# Altium footprint library Molex FFC - FPC Connectors (Through-Hole).PcbLib: 219 footprints (part 3 of 14)
Each footprint in its own frame and in the unit in brackets; x right, y up, seen from the top. Pads: shape width x height; smd on the part's side, far side on the other; paste and mask are expansions set on the pad; w line width, h text height; cw(c..) or ccw(c..) is an arc to the next point about the centre after c.
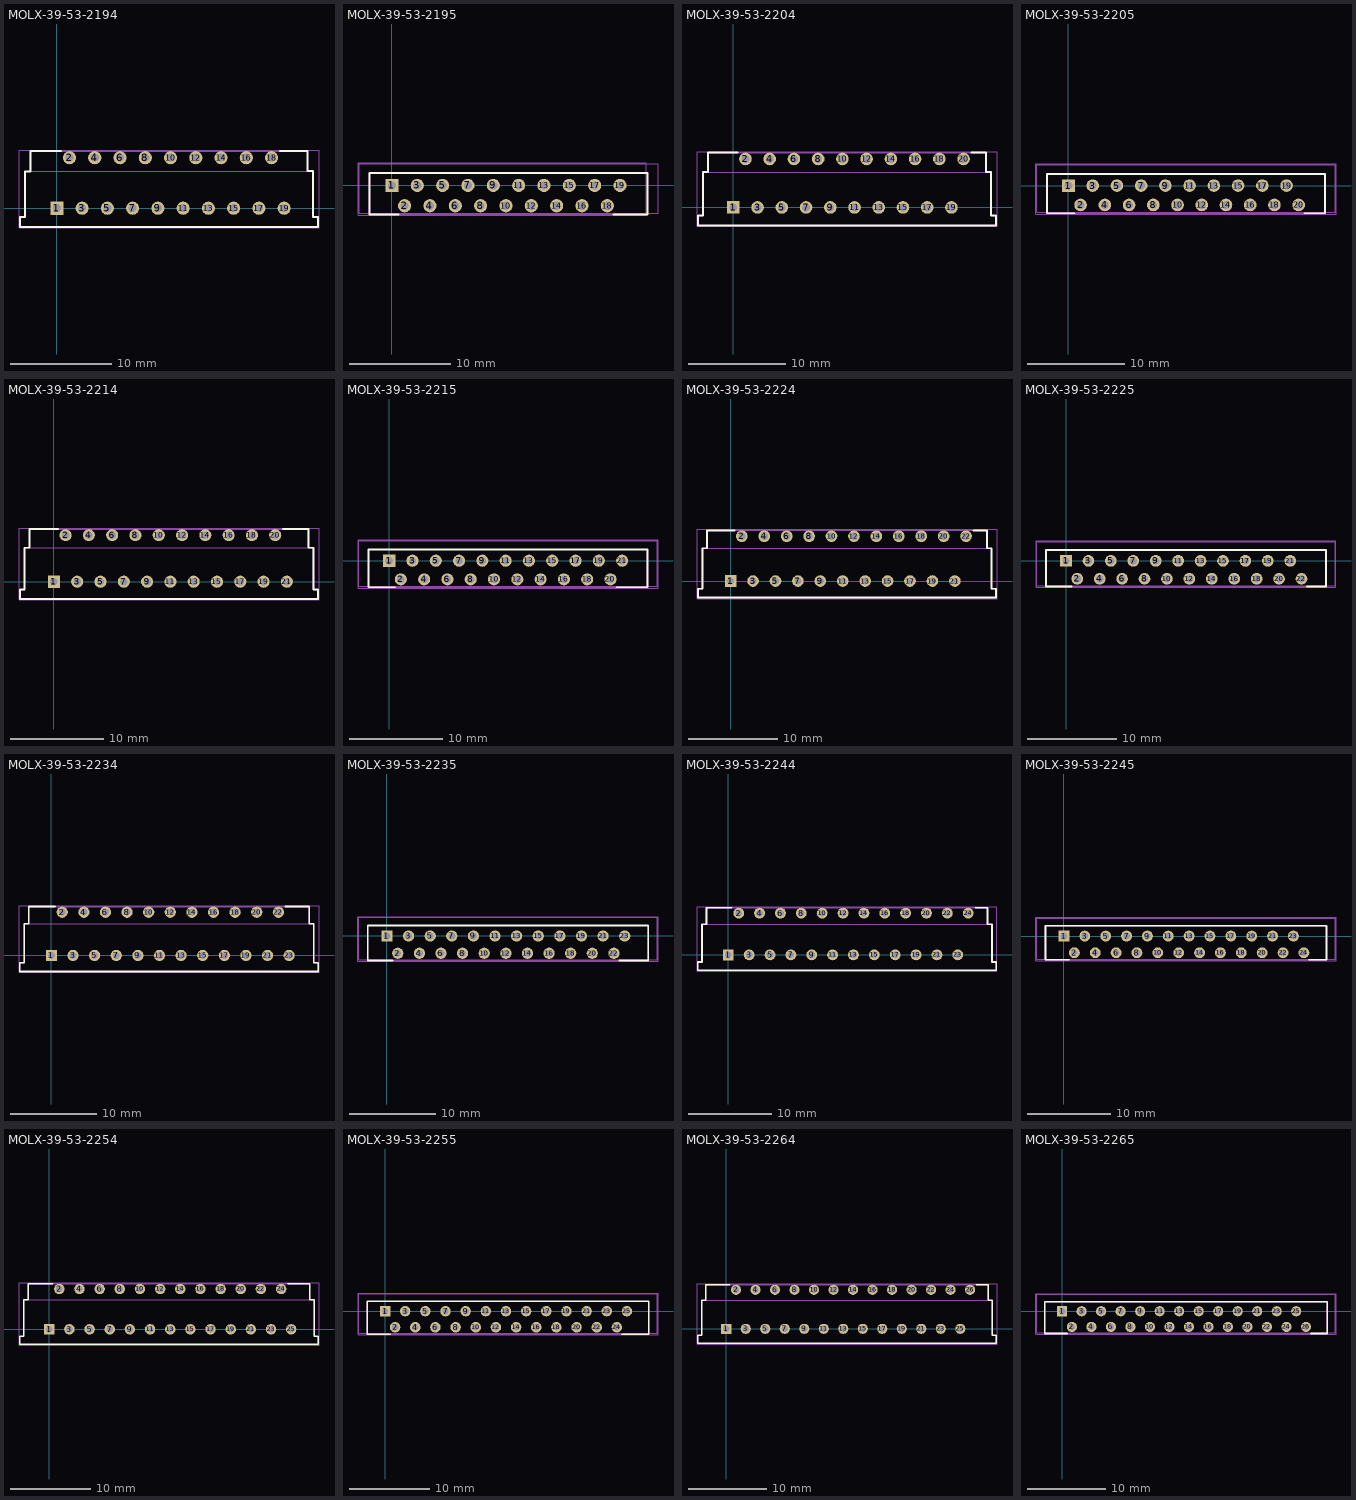
[diagram p2: the footprints below, top view; thin cyan lines are the x and y axes]

## MOLX-39-53-2194 [mm] "FPC Connector, 19-Leads, Right Angle, Pitch 1.25 mm, Mated Height 5.0 mm, Through Hole"
height 5.412
pads (19):
  rect 1.3x1.3 hole 0.8: 1(0,0)
  round 1.3 hole 0.8: 2(1.25,5) 3(2.5,0) 4(3.75,5) 5(5,0) 6(6.25,5) 7(7.5,0) 8(8.75,5) 9(10,0) 10(11.25,5) 11(12.5,0) 12(13.75,5) 13(15,0) 14(16.25,5) 15(17.5,0) 16(18.75,5) 17(20,0) 18(21.25,5) 19(22.5,0)
Top Overlay:
  lines w0.2: -2.62,3.65 -3.15,3.65 -3.15,-0.85 -3.65,-0.85 -3.65,-1.85 25.85,-1.85 25.85,-0.85 25.35,-0.85 25.35,3.65 ; -2.62,3.66 -2.62,5.65 0.425,5.65 ; 22.075,5.65 24.82,5.65 24.82,3.68 25.35,3.68
Mechanical 13:
  lines w0.1: -2.62,3.66 -2.62,5.65 24.82,5.65 24.82,3.68 ; -3.65,-1.85 -3.65,-0.85 -3.15,-0.85 -3.15,3.65 25.35,3.65 25.35,-0.85 25.85,-0.85 25.85,-1.85 -3.65,-1.85
Mechanical 15:
  lines w0.05: -3.75,-1.95 25.95,-1.95 25.95,5.75 -3.75,5.75 -3.75,-1.95
3D body "039532194.stp": height 5.41, standoff -3.49, extent -3.65,-1.85 25.85,5.65

## MOLX-39-53-2195 [mm] "FPC Connector, 19-Leads, Vertical, Pitch 1.25 mm, Mated Height 7.5 mm, Through Hole"
height 7.512
pads (19):
  rect 1.3x1.3 hole 0.8: 1(0,0)
  round 1.3 hole 0.8: 2(1.25,-2) 3(2.5,0) 4(3.75,-2) 5(5,0) 6(6.25,-2) 7(7.5,0) 8(8.75,-2) 9(10,0) 10(11.25,-2) 11(12.5,0) 12(13.75,-2) 13(15,0) 14(16.25,-2) 15(17.5,0) 16(18.75,-2) 17(20,0) 18(21.25,-2) 19(22.5,0)
Top Overlay:
  lines w0.2: 0.633,-2.85 -2.22,-2.85 -2.22,1.22 25.22,1.22 25.22,-2.85 21.867,-2.85
Mechanical 13:
  lines w0.1: -3.25,-2.75 26.25,-2.75 26.25,2.15 -3.25,2.15 -3.25,-2.75 ; -2.22,-2.85 -2.22,1.22 25.22,1.22 25.22,-2.85 -2.22,-2.85
Mechanical 15:
  lines w0.05: -3.35,-2.95 -3.35,2.25 25.1,2.25 25.1,-2.95 -3.35,-2.95
3D body "039532195.stp": height 7.51, standoff -3.49, extent -3.25,-2.85 26.25,2.15

## MOLX-39-53-2204 [mm] "FPC Connector, 20-Leads, Right Angle, Pitch 1.25 mm, Mated Height 5.0 mm, Through Hole"
height 5.412
pads (20):
  rect 1.3x1.3 hole 0.8: 1(0,0)
  round 1.3 hole 0.8: 2(1.25,5) 3(2.5,0) 4(3.75,5) 5(5,0) 6(6.25,5) 7(7.5,0) 8(8.75,5) 9(10,0) 10(11.25,5) 11(12.5,0) 12(13.75,5) 13(15,0) 14(16.25,5) 15(17.5,0) 16(18.75,5) 17(20,0) 18(21.25,5) 19(22.5,0) 20(23.75,5)
Top Overlay:
  lines w0.2: 0.425,5.65 -2.62,5.65 -2.62,3.649 -3.15,3.649 -3.15,-0.85 -3.65,-0.85 -3.65,-1.85 27.1,-1.85 27.1,-0.85 26.6,-0.85 26.6,3.65 26.07,3.65 26.07,5.65 24.575,5.65
Mechanical 13:
  lines w0.1: -2.62,3.649 -3.15,3.649 -3.15,-0.85 -3.65,-0.85 -3.65,-1.85 27.1,-1.85 27.1,-0.85 26.6,-0.85 26.6,3.65 26.07,3.65 26.07,5.65 -2.62,5.65 -2.62,3.649 26.07,3.649
Mechanical 15:
  lines w0.05: -3.75,-1.95 27.2,-1.95 27.2,5.75 -3.75,5.75 -3.75,-1.95
3D body "039532204.stp": height 5.41, standoff -3.49, extent -3.649,-1.849 27.101,5.651

## MOLX-39-53-2205 [mm] "FPC Connector, 20-Leads, Vertical, Pitch 1.25 mm, Mated Height 7.5 mm, Through Hole"
height 7.512
pads (21):
  rect 1.3x1.3 hole 0.8: 1(0,0)
  round 1.3 hole 0.8: 2(1.25,-2) 3(2.5,0) 4(3.75,-2) 5(5,0) 6(6.25,-2) 7(7.5,0) 9(10,0) 10(11.25,-2) 11(12.5,0) 12(13.75,-2) 13(15,0) 14(16.25,-2) 15(17.5,0) 16(18.75,-2) 17(20,0) 17(20,0) 18(21.25,-2) 19(22.5,0) 20(23.75,-2)
  round 1.3 hole 0.762: 8(8.75,-2)
Top Overlay:
  lines w0.2: 0.633,-2.85 -2.22,-2.85 -2.22,1.22 26.47,1.22 26.47,-2.85 24.367,-2.85
Mechanical 13:
  lines w0.1: 27.5,-2.75 27.5,-2.75 ; 27.5,-2.75 27.5,2.15 -3.25,2.15 -3.25,-2.75 27.5,-2.75 ; -2.22,-2.85 -2.22,1.22 26.47,1.22 26.47,-2.85 -2.22,-2.85
Mechanical 15:
  lines w0.05: -3.35,-2.95 27.6,-2.95 27.6,2.25 -3.35,2.25 -3.35,-2.95
3D body "039532205.stp": height 7.51, standoff -3.49, extent -3.25,-2.85 27.5,2.15

## MOLX-39-53-2214 [mm] "FPC Connector, 21-Leads, Right Angle, Pitch 1.25 mm, Mated Height 5.0 mm, Through Hole"
height 5.412
pads (21):
  rect 1.3x1.3 hole 0.8: 1(0,0)
  round 1.3 hole 0.8: 2(1.25,5) 3(2.5,0) 4(3.75,5) 5(5,0) 6(6.25,5) 7(7.5,0) 8(8.75,5) 9(10,0) 10(11.25,5) 11(12.5,0) 12(13.75,5) 13(15,0) 14(16.25,5) 15(17.5,0) 16(18.75,5) 17(20,0) 18(21.25,5) 19(22.5,0) 20(23.75,5) 21(25,0)
Top Overlay:
  lines w0.2: 0.425,5.65 -2.62,5.65 -2.62,3.649 -3.15,3.649 -3.15,-0.85 -3.65,-0.85 -3.65,-1.85 28.35,-1.85 28.35,-0.85 27.85,-0.85 27.85,3.65 27.32,3.65 27.32,5.65 24.575,5.65
Mechanical 13:
  lines w0.1: -2.62,3.649 -3.15,3.649 -3.15,-0.85 -3.65,-0.85 -3.65,-1.85 28.35,-1.85 28.35,-0.85 27.85,-0.85 27.85,3.65 27.32,3.65 27.32,5.65 -2.62,5.65 -2.62,3.649 27.32,3.649
Mechanical 15:
  lines w0.05: -3.75,-1.95 28.45,-1.95 28.45,5.75 -3.75,5.75 -3.75,-1.95
3D body "039532214.stp": height 5.41, standoff -3.49, extent -3.649,-1.85 28.351,5.65

## MOLX-39-53-2215 [mm] "FPC Connector, 21-Leads, Vertical, Pitch 1.25 mm, Mated Height 7.5 mm, Through Hole"
height 7.512
pads (22):
  rect 1.3x1.3 hole 0.8: 1(0,0)
  round 1.3 hole 0.8: 2(1.25,-2) 3(2.5,0) 4(3.75,-2) 5(5,0) 6(6.25,-2) 7(7.5,0) 9(10,0) 10(11.25,-2) 11(12.5,0) 12(13.75,-2) 13(15,0) 14(16.25,-2) 15(17.5,0) 16(18.75,-2) 17(20,0) 17(20,0) 18(21.25,-2) 19(22.5,0) 20(23.75,-2) 21(25,0)
  round 1.3 hole 0.762: 8(8.75,-2)
Top Overlay:
  lines w0.2: 0.633,-2.85 -2.22,-2.85 -2.22,1.22 27.72,1.22 27.72,-2.85 24.367,-2.85
Mechanical 13:
  lines w0.1: -3.25,-2.75 -3.25,2.15 28.75,2.15 28.75,-2.75 -3.25,-2.75 ; -2.22,-2.85 -2.22,1.22 27.72,1.22 27.72,-2.85 -2.22,-2.85
Mechanical 15:
  lines w0.05: -3.35,-2.95 -3.35,2.25 28.85,2.25 28.85,-2.95 -3.35,-2.95
3D body "039532215.stp": height 7.51, standoff -3.49, extent -3.25,-2.85 28.75,2.15

## MOLX-39-53-2224 [mm] "FPC Connector, 22-Leads, Right Angle, Pitch 1.25 mm, Mated Height 5.0 mm, Through Hole"
height 5.412
pads (22):
  rect 1.3x1.3 hole 0.8: 1(0,0)
  round 1.3 hole 0.8: 2(1.25,5) 3(2.5,0) 4(3.75,5) 5(5,0) 6(6.25,5) 7(7.5,0) 8(8.75,5) 9(10,0) 10(11.25,5) 11(12.5,0) 12(13.75,5) 13(15,0) 14(16.25,5) 15(17.5,0) 16(18.75,5) 17(20,0) 18(21.25,5) 19(22.5,0) 20(23.75,5) 21(25,0) 22(26.25,5)
Top Overlay:
  lines w0.2: 0.425,5.65 -2.62,5.65 -2.62,3.649 -3.15,3.649 -3.15,-0.85 -3.65,-0.85 -3.65,-1.85 29.6,-1.85 29.6,-0.85 29.1,-0.85 29.1,3.65 28.57,3.65 28.57,5.65 27.075,5.65
Mechanical 13:
  lines w0.1: -2.62,3.649 -3.15,3.649 -3.15,-0.85 -3.65,-0.85 -3.65,-1.85 29.6,-1.85 29.6,-0.85 29.1,-0.85 29.1,3.65 28.57,3.65 28.57,5.65 -2.62,5.65 -2.62,3.649 28.57,3.649
Mechanical 15:
  lines w0.05: -3.75,-1.95 -3.75,5.75 29.7,5.75 29.7,-1.95 -3.75,-1.95
3D body "039532224.stp": height 5.41, standoff -3.49, extent -3.649,-1.85 29.601,5.65

## MOLX-39-53-2225 [mm] "FPC Connector, 22-Leads, Vertical, Pitch 1.25 mm, Mated Height 7.5 mm, Through Hole"
height 7.512
pads (23):
  rect 1.3x1.3 hole 0.8: 1(0,0)
  round 1.3 hole 0.8: 2(1.25,-2) 3(2.5,0) 4(3.75,-2) 5(5,0) 6(6.25,-2) 7(7.5,0) 9(10,0) 10(11.25,-2) 11(12.5,0) 12(13.75,-2) 13(15,0) 14(16.25,-2) 15(17.5,0) 16(18.75,-2) 17(20,0) 17(20,0) 18(21.25,-2) 19(22.5,0) 20(23.75,-2) 21(25,0) 22(26.25,-2)
  round 1.3 hole 0.762: 8(8.75,-2)
Top Overlay:
  lines w0.2: 0.633,-2.85 -2.22,-2.85 -2.22,1.22 28.97,1.22 28.97,-2.85 26.867,-2.85
Mechanical 13:
  lines w0.1: -3.25,-2.75 30,-2.75 30,2.15 -3.25,2.15 -3.25,-2.75 ; -2.22,-2.85 28.97,-2.85 28.97,1.22 -2.22,1.22 -2.22,-2.85
Mechanical 15:
  lines w0.05: 30,-2.95 -3.35,-2.95 -3.35,2.25 30.1,2.25 30.1,-2.95
3D body "039532225.stp": height 7.51, standoff -3.49, extent -3.25,-2.85 30,2.15

## MOLX-39-53-2234 [mm] "FPC Connector, 23-Leads, Right Angle, Pitch 1.25 mm, Mated Height 5.0 mm, Through Hole"
height 5.412
pads (23):
  rect 1.3x1.3 hole 0.8: 1(0,0)
  round 1.3 hole 0.8: 2(1.25,5) 3(2.5,0) 4(3.75,5) 5(5,0) 6(6.25,5) 7(7.5,0) 8(8.75,5) 9(10,0) 10(11.25,5) 11(12.5,0) 12(13.75,5) 13(15,0) 14(16.25,5) 15(17.5,0) 16(18.75,5) 17(20,0) 18(21.25,5) 19(22.5,0) 20(23.75,5) 21(25,0) 22(26.25,5) 23(27.5,0)
Top Overlay:
  lines w0.2: 0.425,5.65 -2.62,5.65 -2.62,3.649 -3.15,3.649 -3.15,-0.85 -3.65,-0.85 -3.65,-1.85 30.85,-1.85 30.85,-0.85 30.35,-0.85 30.35,3.65 29.82,3.65 29.82,5.65 27.075,5.65
Mechanical 13:
  lines w0.1: -2.62,3.649 -3.15,3.649 -3.15,-0.85 -3.65,-0.85 -3.65,-1.85 30.85,-1.85 30.85,-0.85 30.35,-0.85 30.35,3.65 29.82,3.65 29.82,5.65 -2.62,5.65 -2.62,3.649 29.82,3.649
Mechanical 15:
  lines w0.05: -3.75,-1.95 -3.75,5.75 30.95,5.75 30.95,-1.95 -3.75,-1.95
3D body "039532234.stp": height 5.41, standoff -3.49, extent -3.649,-1.849 30.851,5.651

## MOLX-39-53-2235 [mm] "FPC Connector, 23-Leads, Vertical, Pitch 1.25 mm, Mated Height 7.5 mm, Through Hole"
height 7.512
pads (23):
  rect 1.3x1.3 hole 0.8: 1(0,0)
  round 1.3 hole 0.8: 2(1.25,-2) 3(2.5,0) 4(3.75,-2) 5(5,0) 6(6.25,-2) 7(7.5,0) 8(8.75,-2) 9(10,0) 10(11.25,-2) 11(12.5,0) 12(13.75,-2) 13(15,0) 14(16.25,-2) 15(17.5,0) 16(18.75,-2) 17(20,0) 18(21.25,-2) 19(22.5,0) 20(23.75,-2) 21(25,0) 22(26.25,-2) 23(27.5,0)
Top Overlay:
  lines w0.2: 0.633,-2.85 -2.22,-2.85 -2.22,1.22 30.219,1.22 ; 26.867,-2.85 30.22,-2.85 30.22,1.22
Mechanical 13:
  lines w0.1: -3.25,-2.75 -3.25,2.15 31.25,2.15 31.25,-2.75 -3.25,-2.75 ; -2.22,-2.85 30.22,-2.85 30.22,1.22 -2.22,1.22 -2.22,-2.85
Mechanical 15:
  lines w0.05: -3.35,-2.95 31.35,-2.95 31.35,2.25 -3.35,2.25 -3.35,-2.95
3D body "039532235.stp": height 7.51, standoff -3.49, extent -3.25,-2.85 31.25,2.15

## MOLX-39-53-2244 [mm] "FPC Connector, 24-Leads, Right Angle, Pitch 1.25 mm, Mated Height 5.0 mm, Through Hole"
height 5.412
pads (24):
  rect 1.3x1.3 hole 0.8: 1(0,0)
  round 1.3 hole 0.8: 2(1.25,5) 3(2.5,0) 4(3.75,5) 5(5,0) 6(6.25,5) 7(7.5,0) 8(8.75,5) 9(10,0) 10(11.25,5) 11(12.5,0) 12(13.75,5) 13(15,0) 14(16.25,5) 15(17.5,0) 16(18.75,5) 17(20,0) 18(21.25,5) 19(22.5,0) 20(23.75,5) 21(25,0) 22(26.25,5) 23(27.5,0) 24(28.75,5)
Top Overlay:
  lines w0.2: 0.425,5.65 -2.62,5.65 -2.62,3.65 -3.15,3.65 -3.15,-0.85 -3.65,-0.85 -3.65,-1.85 32.1,-1.85 32.1,-0.85 31.6,-0.85 31.6,3.65 31.07,3.65 31.07,5.65 29.575,5.65 ; 32.075,-1.85 32.075,-1.85
Mechanical 13:
  lines w0.1: -2.62,3.65 -2.62,5.65 31.07,5.65 31.07,3.65 ; -2.62,3.65 -3.15,3.65 -3.15,-0.85 -3.65,-0.85 -3.65,-1.85 32.1,-1.85 32.1,-0.85 31.6,-0.85 31.6,3.65 31.07,3.65 ; -2.62,3.65 31.07,3.65
Mechanical 15:
  lines w0.05: -3.75,-1.95 -3.75,5.75 32.2,5.75 32.2,-1.95 -3.75,-1.95
3D body "039532244.stp": height 5.41, standoff -3.49, extent -3.649,-1.85 32.101,5.65

## MOLX-39-53-2245 [mm] "FPC Connector, 24-Leads, Vertical, Pitch 1.25 mm, Mated Height 7.5 mm, Through Hole"
height 7.512
pads (24):
  rect 1.3x1.3 hole 0.8: 1(0,0)
  round 1.3 hole 0.8: 2(1.25,-2) 3(2.5,0) 4(3.75,-2) 5(5,0) 6(6.25,-2) 7(7.5,0) 8(8.75,-2) 9(10,0) 10(11.25,-2) 11(12.5,0) 12(13.75,-2) 13(15,0) 14(16.25,-2) 15(17.5,0) 16(18.75,-2) 17(20,0) 18(21.25,-2) 19(22.5,0) 20(23.75,-2) 21(25,0) 22(26.25,-2) 23(27.5,0) 24(28.75,-2)
Top Overlay:
  lines w0.2: 0.633,-2.85 -2.22,-2.85 -2.22,1.22 31.47,1.22 31.47,-2.85 29.367,-2.85
Mechanical 13:
  lines w0.1: -3.25,-2.75 32.5,-2.75 32.5,2.15 -3.25,2.15 -3.25,-2.75 ; -2.22,-2.85 -2.22,1.22 31.47,1.22 31.47,-2.85 -2.22,-2.85
Mechanical 15:
  lines w0.05: -3.35,-2.95 -3.35,2.25 32.6,2.25 32.6,-2.95 -3.35,-2.95
3D body "039532245.stp": height 7.51, standoff -3.49, extent -3.25,-2.85 32.5,2.15

## MOLX-39-53-2254 [mm] "FPC Connector, 25-Leads, Right Angle, Pitch 1.25 mm, Mated Height 5.0 mm, Through Hole"
height 5.412
pads (25):
  rect 1.3x1.3 hole 0.8: 1(0,0)
  round 1.3 hole 0.8: 2(1.25,5) 3(2.5,0) 4(3.75,5) 5(5,0) 6(6.25,5) 7(7.5,0) 8(8.75,5) 9(10,0) 10(11.25,5) 11(12.5,0) 12(13.75,5) 13(15,0) 14(16.25,5) 15(17.5,0) 16(18.75,5) 17(20,0) 18(21.25,5) 19(22.5,0) 20(23.75,5) 21(25,0) 22(26.25,5) 23(27.5,0) 24(28.75,5) 25(30,0)
Top Overlay:
  lines w0.2: 0.425,5.65 -2.62,5.65 -2.62,3.65 -3.15,3.65 -3.15,-0.85 -3.65,-0.85 -3.65,-1.85 33.35,-1.85 33.35,-0.85 32.85,-0.85 32.85,3.65 32.32,3.65 32.32,5.65 29.575,5.65 ; 33.325,-1.85 33.325,-1.85
Mechanical 13:
  lines w0.1: -2.62,3.65 -2.62,5.65 32.32,5.65 32.32,3.65 ; -2.62,3.65 -3.15,3.65 -3.15,-0.85 -3.65,-0.85 -3.65,-1.85 33.35,-1.85 33.35,-0.85 32.85,-0.85 32.85,3.65 32.32,3.65 ; -2.62,3.65 32.32,3.65
Mechanical 15:
  lines w0.05: -3.75,-1.95 -3.75,5.75 33.45,5.75 33.45,-1.95 -3.75,-1.95
3D body "039532254.stp": height 5.41, standoff -3.49, extent -3.649,-1.849 33.351,5.651

## MOLX-39-53-2255 [mm] "FPC Connector, 25-Leads, Vertical, Pitch 1.25 mm, Mated Height 7.5 mm, Through Hole"
height 7.512
pads (25):
  rect 1.3x1.3 hole 0.8: 1(0,0)
  round 1.3 hole 0.8: 2(1.25,-2) 3(2.5,0) 4(3.75,-2) 5(5,0) 6(6.25,-2) 7(7.5,0) 8(8.75,-2) 9(10,0) 10(11.25,-2) 11(12.5,0) 12(13.75,-2) 13(15,0) 14(16.25,-2) 15(17.5,0) 16(18.75,-2) 17(20,0) 18(21.25,-2) 19(22.5,0) 20(23.75,-2) 21(25,0) 22(26.25,-2) 23(27.5,0) 24(28.75,-2) 25(30,0)
Top Overlay:
  lines w0.2: 0.633,-2.85 -2.22,-2.85 -2.22,1.22 32.72,1.22 32.72,-2.85 29.367,-2.85
Mechanical 13:
  lines w0.1: -3.25,-2.75 33.75,-2.75 33.75,2.15 -3.25,2.15 -3.25,-2.75 ; -2.22,-2.85 -2.22,1.22 32.72,1.22 32.72,-2.85 -2.22,-2.85
Mechanical 15:
  lines w0.05: -3.35,-2.95 -3.35,2.25 33.85,2.25 33.85,-2.95 -3.35,-2.95
3D body "039532255.stp": height 7.51, standoff -3.49, extent -3.25,-2.85 33.75,2.15

## MOLX-39-53-2264 [mm] "FPC Connector, 26-Leads, Right Angle, Pitch 1.25 mm, Mated Height 5.0 mm, Through Hole"
height 5.412
pads (26):
  rect 1.3x1.3 hole 0.8: 1(0,0)
  round 1.3 hole 0.8: 2(1.25,5) 3(2.5,0) 4(3.75,5) 5(5,0) 6(6.25,5) 7(7.5,0) 8(8.75,5) 9(10,0) 10(11.25,5) 11(12.5,0) 12(13.75,5) 13(15,0) 14(16.25,5) 15(17.5,0) 16(18.75,5) 17(20,0) 18(21.25,5) 19(22.5,0) 20(23.75,5) 21(25,0) 22(26.25,5) 23(27.5,0) 24(28.75,5) 25(30,0) 26(31.25,5)
Top Overlay:
  lines w0.2: 0.425,5.65 -2.62,5.65 -2.62,3.65 -3.15,3.65 -3.15,-0.85 -3.65,-0.85 -3.65,-1.85 34.6,-1.85 34.6,-0.85 34.1,-0.85 34.1,3.65 33.57,3.65 33.57,5.65 32.075,5.65
Mechanical 13:
  lines w0.1: 33.57,5.65 33.57,3.65 ; 33.57,5.65 -2.62,5.65 -2.62,3.65 ; 34.1,-0.85 34.1,3.65 33.57,3.65 ; 34.1,-0.85 34.6,-0.85 34.6,-1.85 -3.65,-1.85 -3.65,-0.85 -3.15,-0.85 -3.15,3.65 -2.62,3.65 ; -2.62,3.65 33.57,3.65
Mechanical 15:
  lines w0.05: -3.75,-1.95 -3.75,5.75 34.7,5.75 34.7,-1.95 -3.75,-1.95
3D body "039532264.stp": height 5.41, standoff -3.49, extent -3.649,-1.85 34.601,5.65

## MOLX-39-53-2265 [mm] "FPC Connector, 26-Leads, Vertical, Pitch 1.25 mm, Mated Height 7.5 mm, Through Hole"
height 7.512
pads (26):
  rect 1.3x1.3 hole 0.8: 1(0,0)
  round 1.3 hole 0.8: 2(1.25,-2) 3(2.5,0) 4(3.75,-2) 5(5,0) 6(6.25,-2) 7(7.5,0) 8(8.75,-2) 9(10,0) 10(11.25,-2) 11(12.5,0) 12(13.75,-2) 13(15,0) 14(16.25,-2) 15(17.5,0) 16(18.75,-2) 17(20,0) 18(21.25,-2) 19(22.5,0) 20(23.75,-2) 21(25,0) 22(26.25,-2) 23(27.5,0) 24(28.75,-2) 25(30,0) 26(31.25,-2)
Top Overlay:
  lines w0.2: 0.633,-2.85 -2.22,-2.85 -2.22,1.22 33.97,1.22 33.97,-2.85 31.867,-2.85
Mechanical 13:
  lines w0.1: -3.25,-2.75 -3.25,2.15 35,2.15 35,-2.75 -3.25,-2.75 ; -2.22,-2.85 33.97,-2.85 33.97,1.22 -2.22,1.22 -2.22,-2.85
Mechanical 15:
  lines w0.05: -3.35,-2.95 35.1,-2.95 35.1,2.25 -3.35,2.25 -3.35,-2.95
3D body "039532265.stp": height 7.51, standoff -3.49, extent -3.25,-2.85 35,2.15